# Altium footprint library texas.PCBLIB: 124 footprints (part 3 of 12) (continued)
## HTQFP-64-PAP [mm] (continued)
  region: 6.2,-0.125 5.2,-0.125 5.2,-0.375 6.2,-0.375
  region: 6.2,0.375 5.2,0.375 5.2,0.125 6.2,0.125
  region: 6.2,0.875 5.2,0.875 5.2,0.625 6.2,0.625
  region: 6.2,1.375 5.2,1.375 5.2,1.125 6.2,1.125
  region: 6.2,1.875 5.2,1.875 5.2,1.625 6.2,1.625
  region: 6.2,2.375 5.2,2.375 5.2,2.125 6.2,2.125
  region: 6.2,2.875 5.2,2.875 5.2,2.625 6.2,2.625
  region: 6.2,3.375 5.2,3.375 5.2,3.125 6.2,3.125
  region: 6.2,3.875 5.2,3.875 5.2,3.625 6.2,3.625
  region: 3.625,6.2 3.625,5.2 3.875,5.2 3.875,6.2
  region: 3.125,6.2 3.125,5.2 3.375,5.2 3.375,6.2
  region: 2.625,6.2 2.625,5.2 2.875,5.2 2.875,6.2
  region: 2.125,6.2 2.125,5.2 2.375,5.2 2.375,6.2
  region: 1.625,6.2 1.625,5.2 1.875,5.2 1.875,6.2
  region: 1.125,6.2 1.125,5.2 1.375,5.2 1.375,6.2
  region: 0.625,6.2 0.625,5.2 0.875,5.2 0.875,6.2
  region: 0.125,6.2 0.125,5.2 0.375,5.2 0.375,6.2
  region: -0.375,6.2 -0.375,5.2 -0.125,5.2 -0.125,6.2
  region: -0.875,6.2 -0.875,5.2 -0.625,5.2 -0.625,6.2
  region: -1.375,6.2 -1.375,5.2 -1.125,5.2 -1.125,6.2
  region: -1.875,6.2 -1.875,5.2 -1.625,5.2 -1.625,6.2
  region: -2.375,6.2 -2.375,5.2 -2.125,5.2 -2.125,6.2
  region: -2.875,6.2 -2.875,5.2 -2.625,5.2 -2.625,6.2
  region: -3.375,6.2 -3.375,5.2 -3.125,5.2 -3.125,6.2
  region: -3.875,6.2 -3.875,5.2 -3.625,5.2 -3.625,6.2
Top Solder:
  rectangle: -6.2,3.625 -5.2,3.875
  rectangle: -6.2,3.125 -5.2,3.375
  rectangle: -6.2,2.625 -5.2,2.875
  rectangle: -6.2,2.125 -5.2,2.375
  rectangle: -6.2,1.625 -5.2,1.875
  rectangle: -6.2,1.125 -5.2,1.375
  rectangle: -6.2,0.625 -5.2,0.875
  rectangle: -6.2,0.125 -5.2,0.375
  rectangle: -6.2,-0.375 -5.2,-0.125
  rectangle: -6.2,-0.875 -5.2,-0.625
  rectangle: -6.2,-1.375 -5.2,-1.125
  rectangle: -6.2,-1.875 -5.2,-1.625
  rectangle: -6.2,-2.375 -5.2,-2.125
  rectangle: -6.2,-2.875 -5.2,-2.625
  rectangle: -6.2,-3.375 -5.2,-3.125
  rectangle: -6.2,-3.875 -5.2,-3.625
  region: -3.625,-6.2 -3.625,-5.2 -3.875,-5.2 -3.875,-6.2
  region: -3.125,-6.2 -3.125,-5.2 -3.375,-5.2 -3.375,-6.2
  region: -2.625,-6.2 -2.625,-5.2 -2.875,-5.2 -2.875,-6.2
  region: -2.125,-6.2 -2.125,-5.2 -2.375,-5.2 -2.375,-6.2
  region: -1.625,-6.2 -1.625,-5.2 -1.875,-5.2 -1.875,-6.2
  region: -1.125,-6.2 -1.125,-5.2 -1.375,-5.2 -1.375,-6.2
  region: -0.625,-6.2 -0.625,-5.2 -0.875,-5.2 -0.875,-6.2
  region: -0.125,-6.2 -0.125,-5.2 -0.375,-5.2 -0.375,-6.2
  region: 0.375,-6.2 0.375,-5.2 0.125,-5.2 0.125,-6.2
  region: 0.875,-6.2 0.875,-5.2 0.625,-5.2 0.625,-6.2
  region: 1.375,-6.2 1.375,-5.2 1.125,-5.2 1.125,-6.2
  region: 1.875,-6.2 1.875,-5.2 1.625,-5.2 1.625,-6.2
  region: 2.375,-6.2 2.375,-5.2 2.125,-5.2 2.125,-6.2
  region: 2.875,-6.2 2.875,-5.2 2.625,-5.2 2.625,-6.2
  region: 3.375,-6.2 3.375,-5.2 3.125,-5.2 3.125,-6.2
  region: 3.875,-6.2 3.875,-5.2 3.625,-5.2 3.625,-6.2
  region: 6.2,-3.625 5.2,-3.625 5.2,-3.875 6.2,-3.875
  region: 6.2,-3.125 5.2,-3.125 5.2,-3.375 6.2,-3.375
  region: 6.2,-2.625 5.2,-2.625 5.2,-2.875 6.2,-2.875
  region: 6.2,-2.125 5.2,-2.125 5.2,-2.375 6.2,-2.375
  region: 6.2,-1.625 5.2,-1.625 5.2,-1.875 6.2,-1.875
  region: 6.2,-1.125 5.2,-1.125 5.2,-1.375 6.2,-1.375
  region: 6.2,-0.625 5.2,-0.625 5.2,-0.875 6.2,-0.875
  region: 6.2,-0.125 5.2,-0.125 5.2,-0.375 6.2,-0.375
  region: 6.2,0.375 5.2,0.375 5.2,0.125 6.2,0.125
  region: 6.2,0.875 5.2,0.875 5.2,0.625 6.2,0.625
  region: 6.2,1.375 5.2,1.375 5.2,1.125 6.2,1.125
  region: 6.2,1.875 5.2,1.875 5.2,1.625 6.2,1.625
  region: 6.2,2.375 5.2,2.375 5.2,2.125 6.2,2.125
  region: 6.2,2.875 5.2,2.875 5.2,2.625 6.2,2.625
  region: 6.2,3.375 5.2,3.375 5.2,3.125 6.2,3.125
  region: 6.2,3.875 5.2,3.875 5.2,3.625 6.2,3.625
  region: 3.625,6.2 3.625,5.2 3.875,5.2 3.875,6.2
  region: 3.125,6.2 3.125,5.2 3.375,5.2 3.375,6.2
  region: 2.625,6.2 2.625,5.2 2.875,5.2 2.875,6.2
  region: 2.125,6.2 2.125,5.2 2.375,5.2 2.375,6.2
  region: 1.625,6.2 1.625,5.2 1.875,5.2 1.875,6.2
  region: 1.125,6.2 1.125,5.2 1.375,5.2 1.375,6.2
  region: 0.625,6.2 0.625,5.2 0.875,5.2 0.875,6.2
  region: 0.125,6.2 0.125,5.2 0.375,5.2 0.375,6.2
  region: -0.375,6.2 -0.375,5.2 -0.125,5.2 -0.125,6.2
  region: -0.875,6.2 -0.875,5.2 -0.625,5.2 -0.625,6.2
  region: -1.375,6.2 -1.375,5.2 -1.125,5.2 -1.125,6.2
  region: -1.875,6.2 -1.875,5.2 -1.625,5.2 -1.625,6.2
  region: -2.375,6.2 -2.375,5.2 -2.125,5.2 -2.125,6.2
  region: -2.875,6.2 -2.875,5.2 -2.625,5.2 -2.625,6.2
  region: -3.375,6.2 -3.375,5.2 -3.125,5.2 -3.125,6.2
  region: -3.875,6.2 -3.875,5.2 -3.625,5.2 -3.625,6.2
  rectangle: -4,-4 4,4
Mechanical 16:
  rectangle: -6.1,3.665 -5.095,3.835
  rectangle: -6.1,3.165 -5.095,3.335
  rectangle: -6.1,2.665 -5.095,2.835
  rectangle: -6.1,2.165 -5.095,2.335
  rectangle: -6.1,1.665 -5.095,1.835
  rectangle: -6.1,1.165 -5.095,1.335
  rectangle: -6.1,0.665 -5.095,0.835
  rectangle: -6.1,0.165 -5.095,0.335
  rectangle: -6.1,-0.335 -5.095,-0.165
  rectangle: -6.1,-0.835 -5.095,-0.665
  rectangle: -6.1,-1.335 -5.095,-1.165
  rectangle: -6.1,-1.835 -5.095,-1.665
  rectangle: -6.1,-2.335 -5.095,-2.165
  rectangle: -6.1,-2.835 -5.095,-2.665
  rectangle: -6.1,-3.335 -5.095,-3.165
  rectangle: -6.1,-3.835 -5.095,-3.665
  region: -3.665,-6.1 -3.665,-5.095 -3.835,-5.095 -3.835,-6.1
  region: -3.165,-6.1 -3.165,-5.095 -3.335,-5.095 -3.335,-6.1
  region: -2.665,-6.1 -2.665,-5.095 -2.835,-5.095 -2.835,-6.1
  region: -2.165,-6.1 -2.165,-5.095 -2.335,-5.095 -2.335,-6.1
  region: -1.665,-6.1 -1.665,-5.095 -1.835,-5.095 -1.835,-6.1
  region: -1.165,-6.1 -1.165,-5.095 -1.335,-5.095 -1.335,-6.1
  region: -0.665,-6.1 -0.665,-5.095 -0.835,-5.095 -0.835,-6.1
  region: -0.165,-6.1 -0.165,-5.095 -0.335,-5.095 -0.335,-6.1
  region: 0.335,-6.1 0.335,-5.095 0.165,-5.095 0.165,-6.1
  region: 0.835,-6.1 0.835,-5.095 0.665,-5.095 0.665,-6.1
  region: 1.335,-6.1 1.335,-5.095 1.165,-5.095 1.165,-6.1
  region: 1.835,-6.1 1.835,-5.095 1.665,-5.095 1.665,-6.1
  region: 2.335,-6.1 2.335,-5.095 2.165,-5.095 2.165,-6.1
  region: 2.835,-6.1 2.835,-5.095 2.665,-5.095 2.665,-6.1
  region: 3.335,-6.1 3.335,-5.095 3.165,-5.095 3.165,-6.1
  region: 3.835,-6.1 3.835,-5.095 3.665,-5.095 3.665,-6.1
  region: 6.1,-3.665 5.095,-3.665 5.095,-3.835 6.1,-3.835
  region: 6.1,-3.165 5.095,-3.165 5.095,-3.335 6.1,-3.335
  region: 6.1,-2.665 5.095,-2.665 5.095,-2.835 6.1,-2.835
  region: 6.1,-2.165 5.095,-2.165 5.095,-2.335 6.1,-2.335
  region: 6.1,-1.665 5.095,-1.665 5.095,-1.835 6.1,-1.835
  region: 6.1,-1.165 5.095,-1.165 5.095,-1.335 6.1,-1.335
  region: 6.1,-0.665 5.095,-0.665 5.095,-0.835 6.1,-0.835
  region: 6.1,-0.165 5.095,-0.165 5.095,-0.335 6.1,-0.335
  region: 6.1,0.335 5.095,0.335 5.095,0.165 6.1,0.165
  region: 6.1,0.835 5.095,0.835 5.095,0.665 6.1,0.665
  region: 6.1,1.335 5.095,1.335 5.095,1.165 6.1,1.165
  region: 6.1,1.835 5.095,1.835 5.095,1.665 6.1,1.665
  region: 6.1,2.335 5.095,2.335 5.095,2.165 6.1,2.165
  region: 6.1,2.835 5.095,2.835 5.095,2.665 6.1,2.665
  region: 6.1,3.335 5.095,3.335 5.095,3.165 6.1,3.165
  region: 6.1,3.835 5.095,3.835 5.095,3.665 6.1,3.665
  region: 3.665,6.1 3.665,5.095 3.835,5.095 3.835,6.1
  region: 3.165,6.1 3.165,5.095 3.335,5.095 3.335,6.1
  region: 2.665,6.1 2.665,5.095 2.835,5.095 2.835,6.1
  region: 2.165,6.1 2.165,5.095 2.335,5.095 2.335,6.1
  region: 1.665,6.1 1.665,5.095 1.835,5.095 1.835,6.1
  region: 1.165,6.1 1.165,5.095 1.335,5.095 1.335,6.1
  region: 0.665,6.1 0.665,5.095 0.835,5.095 0.835,6.1
  region: 0.165,6.1 0.165,5.095 0.335,5.095 0.335,6.1
  region: -0.335,6.1 -0.335,5.095 -0.165,5.095 -0.165,6.1
  region: -0.835,6.1 -0.835,5.095 -0.665,5.095 -0.665,6.1
  region: -1.335,6.1 -1.335,5.095 -1.165,5.095 -1.165,6.1
  region: -1.835,6.1 -1.835,5.095 -1.665,5.095 -1.665,6.1
  region: -2.335,6.1 -2.335,5.095 -2.165,5.095 -2.165,6.1
  region: -2.835,6.1 -2.835,5.095 -2.665,5.095 -2.665,6.1
  region: -3.335,6.1 -3.335,5.095 -3.165,5.095 -3.165,6.1
  region: -3.835,6.1 -3.835,5.095 -3.665,5.095 -3.665,6.1

## HTSSOP8DGN [mm]
pads (9):
  rect 0.4x1 smd: 1(-0.975,-2.15) 2(-0.325,-2.15) 3(0.325,-2.15) 4(0.975,-2.15) 5(0.975,2.15) 6(0.325,2.15) 7(-0.325,2.15) 8(-0.975,2.15)
  rect 3x2 smd: EXP(0,0)
Top Overlay:
  lines w0.102: -1.475,-1.475 1.475,-1.475 1.475,1.475 -1.475,1.475 -1.475,-1.475
Top Paste:
  rectangle: -1.165,-2.64 -0.785,-1.66
  rectangle: -0.515,-2.64 -0.135,-1.66
  rectangle: 0.135,-2.64 0.515,-1.66
  rectangle: 0.785,-2.64 1.165,-1.66
  region: 1.165,2.64 0.785,2.64 0.785,1.66 1.165,1.66
  region: 0.515,2.64 0.135,2.64 0.135,1.66 0.515,1.66
  region: -0.135,2.64 -0.515,2.64 -0.515,1.66 -0.135,1.66
  region: -0.785,2.64 -1.165,2.64 -1.165,1.66 -0.785,1.66
Top Solder:
  rectangle: -1.18,-2.655 -0.77,-1.645
  rectangle: -0.53,-2.655 -0.12,-1.645
  rectangle: 0.12,-2.655 0.53,-1.645
  rectangle: 0.77,-2.655 1.18,-1.645
  region: 1.18,2.655 0.77,2.655 0.77,1.645 1.18,1.645
  region: 0.53,2.655 0.12,2.655 0.12,1.645 0.53,1.645
  region: -0.12,2.655 -0.53,2.655 -0.53,1.645 -0.12,1.645
  region: -0.77,2.655 -1.18,2.655 -1.18,1.645 -0.77,1.645
  rectangle: -1.5,-1 1.5,1
Mechanical 16:
  rectangle: -1.175,-2.49 -0.775,-1.515
  rectangle: -0.525,-2.49 -0.125,-1.515
  rectangle: 0.125,-2.49 0.525,-1.515
  rectangle: 0.775,-2.49 1.175,-1.515
  region: 1.175,2.49 0.775,2.49 0.775,1.515 1.175,1.515
  region: 0.525,2.49 0.125,2.49 0.125,1.515 0.525,1.515
  region: -0.125,2.49 -0.525,2.49 -0.525,1.515 -0.125,1.515
  region: -0.775,2.49 -1.175,2.49 -1.175,1.515 -0.775,1.515

## HTSSOP14PWP [mm]
pads (15):
  rect 0.935x2.1 smd: 1(-2.282,-2.45) 7(2.282,-2.45) 8(2.282,2.45) 14(-2.282,2.45)
  rect 0.27x1.2 smd: 2(-1.3,-2.9) 3(-0.65,-2.9) 4(0,-2.9) 5(0.65,-2.9) 6(1.3,-2.9) 9(1.3,2.9) 10(0.65,2.9) 11(0,2.9) 12(-0.65,2.9) 13(-1.3,2.9)
  rect 5.5x3 smd: EXP(0,0)
Top Overlay:
  circle w0.203: c-1.95,-1.55 r0.3
  lines w0.203: -2.55,-2.15 2.55,-2.15 2.55,2.15 -2.55,2.15 -2.55,-2.15
Top Paste:
  rectangle: -1.7,-1.1 1.7,1.1
  rectangle: -2.08,2.34 -1.82,3.46
  rectangle: -1.43,2.34 -1.17,3.46
  rectangle: -0.78,2.34 -0.52,3.46
  rectangle: -0.13,2.34 0.13,3.46
  rectangle: 0.52,2.34 0.78,3.46
  rectangle: 1.17,2.34 1.43,3.46
  rectangle: 1.82,2.34 2.08,3.46
  region: 2.08,-2.34 1.82,-2.34 1.82,-3.46 2.08,-3.46
  region: 1.43,-2.34 1.17,-2.34 1.17,-3.46 1.43,-3.46
  region: 0.78,-2.34 0.52,-2.34 0.52,-3.46 0.78,-3.46
  region: 0.13,-2.34 -0.13,-2.34 -0.13,-3.46 0.13,-3.46
  region: -0.52,-2.34 -0.78,-2.34 -0.78,-3.46 -0.52,-3.46
  region: -1.17,-2.34 -1.43,-2.34 -1.43,-3.46 -1.17,-3.46
  region: -1.82,-2.34 -2.08,-2.34 -2.08,-3.46 -1.82,-3.46
Top Solder:
  rectangle: -2.085,-3.5 -1.815,-2.3
  rectangle: -1.435,-3.5 -1.165,-2.3
  rectangle: -0.785,-3.5 -0.515,-2.3
  rectangle: -0.135,-3.5 0.135,-2.3
  rectangle: 0.515,-3.5 0.785,-2.3
  rectangle: 1.165,-3.5 1.435,-2.3
  rectangle: 1.815,-3.5 2.085,-2.3
  region: 2.085,3.5 1.815,3.5 1.815,2.3 2.085,2.3
  region: 1.435,3.5 1.165,3.5 1.165,2.3 1.435,2.3
  region: 0.785,3.5 0.515,3.5 0.515,2.3 0.785,2.3
  region: 0.135,3.5 -0.135,3.5 -0.135,2.3 0.135,2.3
  region: -0.515,3.5 -0.785,3.5 -0.785,2.3 -0.515,2.3
  region: -1.165,3.5 -1.435,3.5 -1.435,2.3 -1.165,2.3
  region: -1.815,3.5 -2.085,3.5 -2.085,2.3 -1.815,2.3
  rectangle: -1.89,-1.3 1.89,1.3
Mechanical 16:
  rectangle: -2.1,-3.3 -1.8,-2.2
  rectangle: -1.45,-3.3 -1.15,-2.2
  rectangle: -0.8,-3.3 -0.5,-2.2
  rectangle: -0.15,-3.3 0.15,-2.2
  rectangle: 0.5,-3.3 0.8,-2.2
  rectangle: 1.15,-3.3 1.45,-2.2
  rectangle: 1.8,-3.3 2.1,-2.2
  region: 2.1,3.3 1.8,3.3 1.8,2.2 2.1,2.2
  region: 1.45,3.3 1.15,3.3 1.15,2.2 1.45,2.2
  region: 0.8,3.3 0.5,3.3 0.5,2.2 0.8,2.2
  region: 0.15,3.3 -0.15,3.3 -0.15,2.2 0.15,2.2
  region: -0.5,3.3 -0.8,3.3 -0.8,2.2 -0.5,2.2
  region: -1.15,3.3 -1.45,3.3 -1.45,2.2 -1.15,2.2
  region: -1.8,3.3 -2.1,3.3 -2.1,2.2 -1.8,2.2

## HTSSOP16PWP [mm]
pads (17):
  rect 0.61x2.1 smd: 1(-2.445,-2.45) 8(2.445,-2.45) 9(2.445,2.45) 16(-2.445,2.45)
  rect 0.27x1.2 smd: 2(-1.625,-2.9) 3(-0.975,-2.9) 4(-0.325,-2.9) 5(0.325,-2.9) 6(0.975,-2.9) 7(1.625,-2.9) 10(1.625,2.9) 11(0.975,2.9) 12(0.325,2.9) 13(-0.325,2.9) 14(-0.975,2.9) 15(-1.625,2.9)
  rect 5.5x3 smd: EXP(0,0)
Top Overlay:
  circle w0.203: c-1.95,-1.55 r0.3
  lines w0.203: -2.55,-2.15 2.55,-2.15 2.55,2.15 -2.55,2.15 -2.55,-2.15
Top Paste:
  rectangle: -1.8,-1.2 1.8,1.2
  rectangle: -2.4,-3.48 -2.15,-2.31
  rectangle: -1.75,-3.48 -1.5,-2.31
  rectangle: -1.1,-3.48 -0.85,-2.31
  rectangle: -0.45,-3.48 -0.2,-2.31
  rectangle: 0.2,-3.48 0.45,-2.31
  rectangle: 0.85,-3.48 1.1,-2.31
  rectangle: 1.5,-3.48 1.75,-2.31
  rectangle: 2.15,-3.48 2.4,-2.31
  region: 2.4,3.48 2.15,3.48 2.15,2.31 2.4,2.31
  region: 1.75,3.48 1.5,3.48 1.5,2.31 1.75,2.31
  region: 1.1,3.48 0.85,3.48 0.85,2.31 1.1,2.31
  region: 0.45,3.48 0.2,3.48 0.2,2.31 0.45,2.31
  region: -0.2,3.48 -0.45,3.48 -0.45,2.31 -0.2,2.31
  region: -0.85,3.48 -1.1,3.48 -1.1,2.31 -0.85,2.31
  region: -1.5,3.48 -1.75,3.48 -1.75,2.31 -1.5,2.31
  region: -2.15,3.48 -2.4,3.48 -2.4,2.31 -2.15,2.31
Top Solder:
  rectangle: -2.41,-3.5 -2.14,-2.3
  rectangle: -1.76,-3.5 -1.49,-2.3
  rectangle: -1.11,-3.5 -0.84,-2.3
  rectangle: -0.46,-3.5 -0.19,-2.3
  rectangle: 0.19,-3.5 0.46,-2.3
  rectangle: 0.84,-3.5 1.11,-2.3
  rectangle: 1.49,-3.5 1.76,-2.3
  rectangle: 2.14,-3.5 2.41,-2.3
  region: 2.41,3.5 2.14,3.5 2.14,2.3 2.41,2.3
  region: 1.76,3.5 1.49,3.5 1.49,2.3 1.76,2.3
  region: 1.11,3.5 0.84,3.5 0.84,2.3 1.11,2.3
  region: 0.46,3.5 0.19,3.5 0.19,2.3 0.46,2.3
  region: -0.19,3.5 -0.46,3.5 -0.46,2.3 -0.19,2.3
  region: -0.84,3.5 -1.11,3.5 -1.11,2.3 -0.84,2.3
  region: -1.49,3.5 -1.76,3.5 -1.76,2.3 -1.49,2.3
  region: -2.14,3.5 -2.41,3.5 -2.41,2.3 -2.14,2.3
  rectangle: -1.89,-1.3 1.89,1.3
Mechanical 16:
  rectangle: -2.425,-3.3 -2.125,-2.2
  rectangle: -1.775,-3.3 -1.475,-2.2
  rectangle: -1.125,-3.3 -0.825,-2.2
  rectangle: -0.475,-3.3 -0.175,-2.2
  rectangle: 0.175,-3.3 0.475,-2.2
  rectangle: 0.825,-3.3 1.125,-2.2
  rectangle: 1.475,-3.3 1.775,-2.2
  rectangle: 2.125,-3.3 2.425,-2.2
  region: 2.425,3.3 2.125,3.3 2.125,2.2 2.425,2.2
  region: 1.775,3.3 1.475,3.3 1.475,2.2 1.775,2.2
  region: 1.125,3.3 0.825,3.3 0.825,2.2 1.125,2.2
  region: 0.475,3.3 0.175,3.3 0.175,2.2 0.475,2.2
  region: -0.175,3.3 -0.475,3.3 -0.475,2.2 -0.175,2.2
  region: -0.825,3.3 -1.125,3.3 -1.125,2.2 -0.825,2.2
  region: -1.475,3.3 -1.775,3.3 -1.775,2.2 -1.475,2.2
  region: -2.125,3.3 -2.425,3.3 -2.425,2.2 -2.125,2.2

## HTSSOP20PWP [mm]
pads (21):
  rect 0.61x2.1 smd: 1(-3.095,-2.45) 10(3.095,-2.45) 11(3.095,2.45) 20(-3.095,2.45)
  rect 0.27x1.2 smd: 2(-2.275,-2.9) 3(-1.625,-2.9) 4(-0.975,-2.9) 5(-0.325,-2.9) 6(0.325,-2.9) 7(0.975,-2.9) 8(1.625,-2.9) 9(2.275,-2.9) 12(2.275,2.9) 13(1.625,2.9) 14(0.975,2.9) 15(0.325,2.9) 16(-0.325,2.9) 17(-0.975,2.9) 18(-1.625,2.9) 19(-2.275,2.9)
  rect 6.8x3 smd: EXP(0,0)
Top Overlay:
  circle w0.203: c-2.55,-1.5 r0.3
  lines w0.203: -3.2,-2.15 3.2,-2.15 3.2,2.15 -3.2,2.15 -3.2,-2.15
Top Paste:
  rectangle: -3.05,-3.48 -2.8,-2.31
  rectangle: -2.4,-3.48 -2.15,-2.31
  rectangle: -1.75,-3.48 -1.5,-2.31
  rectangle: -1.1,-3.48 -0.85,-2.31
  rectangle: -0.45,-3.48 -0.2,-2.31
  rectangle: 0.2,-3.48 0.45,-2.31
  rectangle: 0.85,-3.48 1.1,-2.31
  rectangle: 1.5,-3.48 1.75,-2.31
  rectangle: 2.15,-3.48 2.4,-2.31
  rectangle: 2.8,-3.48 3.05,-2.31
  region: 3.05,3.48 2.8,3.48 2.8,2.31 3.05,2.31
  region: 2.4,3.48 2.15,3.48 2.15,2.31 2.4,2.31
  region: 1.75,3.48 1.5,3.48 1.5,2.31 1.75,2.31
  region: 1.1,3.48 0.85,3.48 0.85,2.31 1.1,2.31
  region: 0.45,3.48 0.2,3.48 0.2,2.31 0.45,2.31
  region: -0.2,3.48 -0.45,3.48 -0.45,2.31 -0.2,2.31
  region: -0.85,3.48 -1.1,3.48 -1.1,2.31 -0.85,2.31
  region: -1.5,3.48 -1.75,3.48 -1.75,2.31 -1.5,2.31
  region: -2.15,3.48 -2.4,3.48 -2.4,2.31 -2.15,2.31
  region: -2.8,3.48 -3.05,3.48 -3.05,2.31 -2.8,2.31
  rectangle: -1.8,-1.2 1.8,1.2
Top Solder:
  rectangle: -3.06,-3.5 -2.79,-2.3
  rectangle: -2.41,-3.5 -2.14,-2.3
  rectangle: -1.76,-3.5 -1.49,-2.3
  rectangle: -1.11,-3.5 -0.84,-2.3
  rectangle: -0.46,-3.5 -0.19,-2.3
  rectangle: 0.19,-3.5 0.46,-2.3
  rectangle: 0.84,-3.5 1.11,-2.3
  rectangle: 1.49,-3.5 1.76,-2.3
  rectangle: 2.14,-3.5 2.41,-2.3
  rectangle: 2.79,-3.5 3.06,-2.3
  region: 3.06,3.5 2.79,3.5 2.79,2.3 3.06,2.3
  region: 2.41,3.5 2.14,3.5 2.14,2.3 2.41,2.3
  region: 1.76,3.5 1.49,3.5 1.49,2.3 1.76,2.3
  region: 1.11,3.5 0.84,3.5 0.84,2.3 1.11,2.3
  region: 0.46,3.5 0.19,3.5 0.19,2.3 0.46,2.3
  region: -0.19,3.5 -0.46,3.5 -0.46,2.3 -0.19,2.3
  region: -0.84,3.5 -1.11,3.5 -1.11,2.3 -0.84,2.3
  region: -1.49,3.5 -1.76,3.5 -1.76,2.3 -1.49,2.3
  region: -2.14,3.5 -2.41,3.5 -2.41,2.3 -2.14,2.3
  region: -2.79,3.5 -3.06,3.5 -3.06,2.3 -2.79,2.3
  rectangle: -1.89,-1.3 1.89,1.3
Mechanical 16:
  rectangle: -3.075,-3.3 -2.775,-2.2
  rectangle: -2.425,-3.3 -2.125,-2.2
  rectangle: -1.775,-3.3 -1.475,-2.2
  rectangle: -1.125,-3.3 -0.825,-2.2
  rectangle: -0.475,-3.3 -0.175,-2.2
  rectangle: 0.175,-3.3 0.475,-2.2
  rectangle: 0.825,-3.3 1.125,-2.2
  rectangle: 1.475,-3.3 1.775,-2.2
  rectangle: 2.125,-3.3 2.425,-2.2
  rectangle: 2.775,-3.3 3.075,-2.2
  region: 3.075,3.3 2.775,3.3 2.775,2.2 3.075,2.2
  region: 2.425,3.3 2.125,3.3 2.125,2.2 2.425,2.2
  region: 1.775,3.3 1.475,3.3 1.475,2.2 1.775,2.2
  region: 1.125,3.3 0.825,3.3 0.825,2.2 1.125,2.2
  region: 0.475,3.3 0.175,3.3 0.175,2.2 0.475,2.2
  region: -0.175,3.3 -0.475,3.3 -0.475,2.2 -0.175,2.2
  region: -0.825,3.3 -1.125,3.3 -1.125,2.2 -0.825,2.2
  region: -1.475,3.3 -1.775,3.3 -1.775,2.2 -1.475,2.2
  region: -2.125,3.3 -2.425,3.3 -2.425,2.2 -2.125,2.2
  region: -2.775,3.3 -3.075,3.3 -3.075,2.2 -2.775,2.2

## HTSSOP24PWP [mm]
pads (25):
  rect 0.61x2.1 smd: 1(-3.745,-2.45) 12(3.745,-2.45) 13(3.745,2.45) 24(-3.745,2.45)
  rect 0.27x1.2 smd: 2(-2.925,-2.9) 3(-2.275,-2.9) 4(-1.625,-2.9) 5(-0.975,-2.9) 6(-0.325,-2.9) 7(0.325,-2.9) 8(0.975,-2.9) 9(1.625,-2.9) 10(2.275,-2.9) 11(2.925,-2.9) 14(2.925,2.9) 15(2.275,2.9) 16(1.625,2.9) 17(0.975,2.9) 18(0.325,2.9) 19(-0.325,2.9) 20(-0.975,2.9) 21(-1.625,2.9) 22(-2.275,2.9) 23(-2.925,2.9)
  rect 8.1x3 smd: EXP(0,0)
Top Overlay:
  circle w0.203: c-3.15,-1.5 r0.3
  lines w0.203: -3.85,-2.15 3.85,-2.15 3.85,2.15 -3.85,2.15 -3.85,-2.15
Top Paste:
  rectangle: -2.4,-1.2 2.4,1.2
  rectangle: -3.7,-3.48 -3.45,-2.31
  rectangle: -3.05,-3.48 -2.8,-2.31
  rectangle: -2.4,-3.48 -2.15,-2.31
  rectangle: -1.75,-3.48 -1.5,-2.31
  rectangle: -1.1,-3.48 -0.85,-2.31
  rectangle: -0.45,-3.48 -0.2,-2.31
  rectangle: 0.2,-3.48 0.45,-2.31
  rectangle: 0.85,-3.48 1.1,-2.31
  rectangle: 1.5,-3.48 1.75,-2.31
  rectangle: 2.15,-3.48 2.4,-2.31
  rectangle: 2.8,-3.48 3.05,-2.31
  rectangle: 3.45,-3.48 3.7,-2.31
  region: 3.7,3.48 3.45,3.48 3.45,2.31 3.7,2.31
  region: 3.05,3.48 2.8,3.48 2.8,2.31 3.05,2.31
  region: 2.4,3.48 2.15,3.48 2.15,2.31 2.4,2.31
  region: 1.75,3.48 1.5,3.48 1.5,2.31 1.75,2.31
  region: 1.1,3.48 0.85,3.48 0.85,2.31 1.1,2.31
  region: 0.45,3.48 0.2,3.48 0.2,2.31 0.45,2.31
  region: -0.2,3.48 -0.45,3.48 -0.45,2.31 -0.2,2.31
  region: -0.85,3.48 -1.1,3.48 -1.1,2.31 -0.85,2.31
  region: -1.5,3.48 -1.75,3.48 -1.75,2.31 -1.5,2.31
  region: -2.15,3.48 -2.4,3.48 -2.4,2.31 -2.15,2.31
  region: -2.8,3.48 -3.05,3.48 -3.05,2.31 -2.8,2.31
  region: -3.45,3.48 -3.7,3.48 -3.7,2.31 -3.45,2.31
Top Solder:
  rectangle: -3.71,-3.5 -3.44,-2.3
  rectangle: -3.06,-3.5 -2.79,-2.3
  rectangle: -2.41,-3.5 -2.14,-2.3
  rectangle: -1.76,-3.5 -1.49,-2.3
  rectangle: -1.11,-3.5 -0.84,-2.3
  rectangle: -0.46,-3.5 -0.19,-2.3
  rectangle: 0.19,-3.5 0.46,-2.3
  rectangle: 0.84,-3.5 1.11,-2.3
  rectangle: 1.49,-3.5 1.76,-2.3
  rectangle: 2.14,-3.5 2.41,-2.3
  rectangle: 2.79,-3.5 3.06,-2.3
  rectangle: 3.44,-3.5 3.71,-2.3
  region: 3.71,3.5 3.44,3.5 3.44,2.3 3.71,2.3
  region: 3.06,3.5 2.79,3.5 2.79,2.3 3.06,2.3
  region: 2.41,3.5 2.14,3.5 2.14,2.3 2.41,2.3
  region: 1.76,3.5 1.49,3.5 1.49,2.3 1.76,2.3
  region: 1.11,3.5 0.84,3.5 0.84,2.3 1.11,2.3
  region: 0.46,3.5 0.19,3.5 0.19,2.3 0.46,2.3
  region: -0.19,3.5 -0.46,3.5 -0.46,2.3 -0.19,2.3
  region: -0.84,3.5 -1.11,3.5 -1.11,2.3 -0.84,2.3
  region: -1.49,3.5 -1.76,3.5 -1.76,2.3 -1.49,2.3
  region: -2.14,3.5 -2.41,3.5 -2.41,2.3 -2.14,2.3
  region: -2.79,3.5 -3.06,3.5 -3.06,2.3 -2.79,2.3
  region: -3.44,3.5 -3.71,3.5 -3.71,2.3 -3.44,2.3
  rectangle: -2.54,-1.3 2.54,1.3
Mechanical 16:
  rectangle: -3.725,-3.3 -3.425,-2.2
  rectangle: -3.075,-3.3 -2.775,-2.2
  rectangle: -2.425,-3.3 -2.125,-2.2
  rectangle: -1.775,-3.3 -1.475,-2.2
  rectangle: -1.125,-3.3 -0.825,-2.2
  rectangle: -0.475,-3.3 -0.175,-2.2
  rectangle: 0.175,-3.3 0.475,-2.2
  rectangle: 0.825,-3.3 1.125,-2.2
  rectangle: 1.475,-3.3 1.775,-2.2
  rectangle: 2.125,-3.3 2.425,-2.2
  rectangle: 2.775,-3.3 3.075,-2.2
  rectangle: 3.425,-3.3 3.725,-2.2
  region: 3.725,3.3 3.425,3.3 3.425,2.2 3.725,2.2
  region: 3.075,3.3 2.775,3.3 2.775,2.2 3.075,2.2
  region: 2.425,3.3 2.125,3.3 2.125,2.2 2.425,2.2
  region: 1.775,3.3 1.475,3.3 1.475,2.2 1.775,2.2
  region: 1.125,3.3 0.825,3.3 0.825,2.2 1.125,2.2
  region: 0.475,3.3 0.175,3.3 0.175,2.2 0.475,2.2
  region: -0.175,3.3 -0.475,3.3 -0.475,2.2 -0.175,2.2
  region: -0.825,3.3 -1.125,3.3 -1.125,2.2 -0.825,2.2
  region: -1.475,3.3 -1.775,3.3 -1.775,2.2 -1.475,2.2
  region: -2.125,3.3 -2.425,3.3 -2.425,2.2 -2.125,2.2
  region: -2.775,3.3 -3.075,3.3 -3.075,2.2 -2.775,2.2
  region: -3.425,3.3 -3.725,3.3 -3.725,2.2 -3.425,2.2

## HTSSOP28DAP [mm]
pads (29):
  rect 0.3x1 smd: 1(-4.225,-3.95) 2(-3.575,-3.95) 3(-2.925,-3.95) 4(-2.275,-3.95) 5(-1.625,-3.95) 6(-0.975,-3.95) 7(-0.325,-3.95) 8(0.325,-3.95) 9(0.975,-3.95) 10(1.625,-3.95) 11(2.275,-3.95) 12(2.925,-3.95) 13(3.575,-3.95) 14(4.225,-3.95) 15(4.225,3.95) 16(3.575,3.95) 17(2.925,3.95) 18(2.275,3.95) 19(1.625,3.95) 20(0.975,3.95) 21(0.325,3.95) 22(-0.325,3.95) 23(-0.975,3.95) 24(-1.625,3.95) 25(-2.275,3.95) 26(-2.925,3.95) 27(-3.575,3.95) 28(-4.225,3.95)
  rect 9.7x5.2 smd: EXP(0,0)
Top Overlay:
  circle w0.102: c-3.9,-2.6 r0.325
  lines w0.102: -4.85,-3.4 4.85,-3.4 4.85,3.4 -4.85,3.4 -4.85,-3.4
Top Solder:
  rectangle: -4.385,-4.46 -4.065,-3.44
  rectangle: -4.37,-4.445 -4.08,-3.455
  rectangle: -3.735,-4.46 -3.415,-3.44
  rectangle: -3.72,-4.445 -3.43,-3.455
  rectangle: -3.085,-4.46 -2.765,-3.44
  rectangle: -3.07,-4.445 -2.78,-3.455
  rectangle: -2.435,-4.46 -2.115,-3.44
  rectangle: -2.42,-4.445 -2.13,-3.455
  rectangle: -1.785,-4.46 -1.465,-3.44
  rectangle: -1.77,-4.445 -1.48,-3.455
  rectangle: -1.135,-4.46 -0.815,-3.44
  rectangle: -1.12,-4.445 -0.83,-3.455
  rectangle: -0.485,-4.46 -0.165,-3.44
  rectangle: -0.47,-4.445 -0.18,-3.455
  rectangle: 0.165,-4.46 0.485,-3.44
  rectangle: 0.18,-4.445 0.47,-3.455
  rectangle: 0.815,-4.46 1.135,-3.44
  rectangle: 0.83,-4.445 1.12,-3.455
  rectangle: 1.465,-4.46 1.785,-3.44
  rectangle: 1.48,-4.445 1.77,-3.455
  rectangle: 2.115,-4.46 2.435,-3.44
  rectangle: 2.13,-4.445 2.42,-3.455
  rectangle: 2.765,-4.46 3.085,-3.44
  rectangle: 2.78,-4.445 3.07,-3.455
  rectangle: 3.415,-4.46 3.735,-3.44
  rectangle: 3.43,-4.445 3.72,-3.455
  rectangle: 4.065,-4.46 4.385,-3.44
  rectangle: 4.08,-4.445 4.37,-3.455
  region: 4.385,4.46 4.065,4.46 4.065,3.44 4.385,3.44
  region: 4.37,4.445 4.08,4.445 4.08,3.455 4.37,3.455
  region: 3.735,4.46 3.415,4.46 3.415,3.44 3.735,3.44
  region: 3.72,4.445 3.43,4.445 3.43,3.455 3.72,3.455
  region: 3.085,4.46 2.765,4.46 2.765,3.44 3.085,3.44
  region: 3.07,4.445 2.78,4.445 2.78,3.455 3.07,3.455
  region: 2.435,4.46 2.115,4.46 2.115,3.44 2.435,3.44
  region: 2.42,4.445 2.13,4.445 2.13,3.455 2.42,3.455
  region: 1.785,4.46 1.465,4.46 1.465,3.44 1.785,3.44
  region: 1.77,4.445 1.48,4.445 1.48,3.455 1.77,3.455
  region: 1.135,4.46 0.815,4.46 0.815,3.44 1.135,3.44
  region: 1.12,4.445 0.83,4.445 0.83,3.455 1.12,3.455
  region: 0.485,4.46 0.165,4.46 0.165,3.44 0.485,3.44
  region: 0.47,4.445 0.18,4.445 0.18,3.455 0.47,3.455
  region: -0.165,4.46 -0.485,4.46 -0.485,3.44 -0.165,3.44
  region: -0.18,4.445 -0.47,4.445 -0.47,3.455 -0.18,3.455
  region: -0.815,4.46 -1.135,4.46 -1.135,3.44 -0.815,3.44
  region: -0.83,4.445 -1.12,4.445 -1.12,3.455 -0.83,3.455
  region: -1.465,4.46 -1.785,4.46 -1.785,3.44 -1.465,3.44
  region: -1.48,4.445 -1.77,4.445 -1.77,3.455 -1.48,3.455
  region: -2.115,4.46 -2.435,4.46 -2.435,3.44 -2.115,3.44
  region: -2.13,4.445 -2.42,4.445 -2.42,3.455 -2.13,3.455
  region: -2.765,4.46 -3.085,4.46 -3.085,3.44 -2.765,3.44
  region: -2.78,4.445 -3.07,4.445 -3.07,3.455 -2.78,3.455
  region: -3.415,4.46 -3.735,4.46 -3.735,3.44 -3.415,3.44
  region: -3.43,4.445 -3.72,4.445 -3.72,3.455 -3.43,3.455
  region: -4.065,4.46 -4.385,4.46 -4.385,3.44 -4.065,3.44
  region: -4.08,4.445 -4.37,4.445 -4.37,3.455 -4.08,3.455
  rectangle: -4.85,-2.6 4.85,2.6
Mechanical 16:
  rectangle: -4.375,-4.2 -4.075,-3.45
  rectangle: -3.725,-4.2 -3.425,-3.45
  rectangle: -3.075,-4.2 -2.775,-3.45
  rectangle: -2.425,-4.2 -2.125,-3.45
  rectangle: -1.775,-4.2 -1.475,-3.45
  rectangle: -1.125,-4.2 -0.825,-3.45
  rectangle: -0.475,-4.2 -0.175,-3.45
  rectangle: 0.175,-4.2 0.475,-3.45
  rectangle: 0.825,-4.2 1.125,-3.45
  rectangle: 1.475,-4.2 1.775,-3.45
  rectangle: 2.125,-4.2 2.425,-3.45
  rectangle: 2.775,-4.2 3.075,-3.45
  rectangle: 3.425,-4.2 3.725,-3.45
  rectangle: 4.075,-4.2 4.375,-3.45
  region: 4.375,4.2 4.075,4.2 4.075,3.45 4.375,3.45
  region: 3.725,4.2 3.425,4.2 3.425,3.45 3.725,3.45
  region: 3.075,4.2 2.775,4.2 2.775,3.45 3.075,3.45
  region: 2.425,4.2 2.125,4.2 2.125,3.45 2.425,3.45
  region: 1.775,4.2 1.475,4.2 1.475,3.45 1.775,3.45
  region: 1.125,4.2 0.825,4.2 0.825,3.45 1.125,3.45
  region: 0.475,4.2 0.175,4.2 0.175,3.45 0.475,3.45
  region: -0.175,4.2 -0.475,4.2 -0.475,3.45 -0.175,3.45
  region: -0.825,4.2 -1.125,4.2 -1.125,3.45 -0.825,3.45
  region: -1.475,4.2 -1.775,4.2 -1.775,3.45 -1.475,3.45
  region: -2.125,4.2 -2.425,4.2 -2.425,3.45 -2.125,3.45
  region: -2.775,4.2 -3.075,4.2 -3.075,3.45 -2.775,3.45
  region: -3.425,4.2 -3.725,4.2 -3.725,3.45 -3.425,3.45
  region: -4.075,4.2 -4.375,4.2 -4.375,3.45 -4.075,3.45